# Altium footprint library USBConnectors.PCBLIB: 18 footprints (part 2 of 2)
Each footprint in its own frame and in the unit in brackets; x right, y up, seen from the top. Pads: shape width x height; smd on the part's side, far side on the other; paste and mask are expansions set on the pad; w line width, h text height; cw(c..) or ccw(c..) is an arc to the next point about the centre after c.
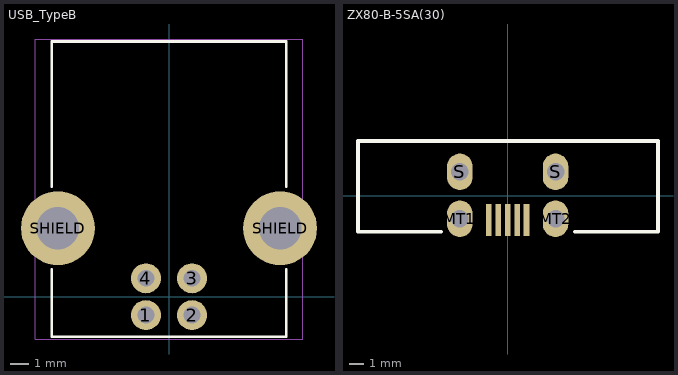
[diagram p1: the footprints below, top view; thin cyan lines are the x and y axes]

## USB_TypeB [mm]
height 11.1
pads (6):
  round 1.626 hole 0.914 mask+0.025: 1(-1.25,-0.995) 2(1.25,-0.995) 3(1.25,1.005) 4(-1.25,1.005)
  round 4 hole 2.3 mask+0: SHIELD(-6.02,3.715) SHIELD(6.02,3.715)
Top Overlay:
  lines w0.152: -6.35,1.495 -6.35,-2.159 6.35,-2.159 6.35,1.495 ; -6.35,5.969 -6.35,13.843 6.35,13.843 6.35,5.969
Mechanical 14:
  lines w0.051: -7.239,-2.286 7.239,-2.286 7.239,13.97 -7.239,13.97 -7.239,-2.286
3D body "User Library-Samtec - USB-B-S-X-W-TH.STEP": height 11.01, standoff -3.63, extent -7.374,-2.413 7.425,14.087

## ZX80-B-5SA(30) [mm]
pads (9):
  rect 0.4x2.2 smd: 1(-1.3,-1.649) 2(-0.65,-1.649) 3(0,-1.649) 4(0.65,-1.649) 5(1.3,-1.649)
  oval 1.75x2.5 hole 1.2: MT1(-3.281,-1.573) MT2(3.281,-1.572) S(-3.281,1.649) S(3.281,1.649)
Top Overlay:
  lines w0.254: -4.551,-2.462 -10.266,-2.462 -10.266,3.761 10.308,3.761 10.308,-2.462 4.593,-2.462
3D body "ZX80-B-5SA.stp": height 13.01, standoff -1.14, extent -10.26,-2.504 10.29,3.796